# Altium schematic symbol library Schlib.SchLib: 725 symbols (part 6 of 6) (continued)
## TXU0202DTTR
designator U?  (value not drawn)
Two channel fixed-direction level shifter with channels in opposite direction 8-X1SON -40 to 125; Manufacturer: Texas Instruments; Manufacturer Part Number: TXU0202DTTR; Manufacturer Lifecycle Status: ACTIVE; Number of Bits: 2; Supplier: DigiKey; Supplier Part Number: 296-TXU0202DTTRCT-ND; RoHS: Compliant; Category: Voltage Level Shifters; Stock: 4847; Pricing: 1=0.87, 10=0.625, 25=0.5632, 100=0.4949, 250=0.46236, 500=0.4427, 1000=0.42653, 2500=0.40946 (USD); Height: 0m; Length: 1.95mm; Lifecycle Status: Production; Pins: 8; Thickness: 500µm; Width: 1mm; ComponentLink1URL: https://octopart.com:443/opatz8j6/c1?t=p2HXJZBWE-pFoGEOlTjneCnrTkOmH9OxJ_HYdxurKIxSMmIV7N165-jHYGvPUTMIo6_KOagWcpwktg73tXujiVlnUB25hWRjqx6WtDye6qoWhfVu_4d7LnAJ6IkgstcHD4eiH1vlKoDQ2CBJMnPhzI5VAqNwqGUYp90ptjP2t89KyW0ve0Qzd1SuLJzpthln_wwcV8ZzKvLgO7tUY6x9nW2xdtjP7opLNr3Cftf4ocqDTC1i5N5gd5Px9BM7tkVD3T5De5UbGMoRdoeYFjpKWo_XfVgtY4nhCpq51Aae6M7yB6GkqIjur8ipHWO-6hrI4PUfbH8dKUG2HdLonZ1LGPRiB1iUb2ss8JtJM2Z2JwUvC4Z96EvPJwuKPjqCUOgvrNCZub9Y&src-supplier=Texas+Instruments; ComponentLink1Description: https://octopart.com:443/opatz8j6/c1?t=p2HXJZBWE-pFoGEOlTjneCnrTkOmH9OxJ_HYdxurKIxSMmIV7N165-jHYGvPUTMIo6_KOagWcpwktg73tXujiVlnUB25hWRjqx6WtDye6qoWhfVu_4d7LnAJ6IkgstcHD4eiH1vlKoDQ2CBJMnPhzI5VAqNwqGUYp90ptjP2t89KyW0ve0Qzd1SuLJzpthln_wwcV8ZzKvLgO7tUY6x9nW2xdtjP7opLNr3Cftf4ocqDTC1i5N5gd5Px9BM7tkVD3T5De5UbGMoRdoeYFjpKWo_XfVgtY4nhCpq51Aae6M7yB6GkqIjur8ipHWO-6hrI4PUfbH8dKUG2HdLonZ1LGPRiB1iUb2ss8JtJM2Z2JwUvC4Z96EvPJwuKPjqCUOgvrNCZub9Y&src-supplier=Texas+Instruments; ComponentLink2URL: https://datasheet.octopart.com:443/TXU0202DTTR-Texas-Instruments-datasheet-184244561.pdf?src-supplier=LCSC; ComponentLink2Description: https://datasheet.octopart.com:443/TXU0202DTTR-Texas-Instruments-datasheet-184244561.pdf?src-supplier=LCSC; ComponentLink3URL: http://sigma.octopart.com:80/conflict_mineral_statement/Texas-Instruments-company-63.pdf?src-supplier=Compliance+Statements; ComponentLink3Description: http://sigma.octopart.com:80/conflict_mineral_statement/Texas-Instruments-company-63.pdf?src-supplier=Compliance+Statements; ComponentLink4URL: http://sigma.octopart.com:80/reach_statement/Texas-Instruments-company-64.pdf?src-supplier=Compliance+Statements; ComponentLink4Description: http://sigma.octopart.com:80/reach_statement/Texas-Instruments-company-64.pdf?src-supplier=Compliance+Statements
footprint TXU0202DTTR
pins: 1 B2, 2 GND, 3 VCCA, 4 A2Y, 5 A1, 6 OE, 7 VCCB, 8 B1Y

## UJ2-MIBH-G-SMT-TR
designator J?  (value not drawn)
Micro B, USB 2.0, 1.8 A, Right Angle, Surface Mount (SMT), USB Receptacle; MF: CUI Devices; MP: UJ2-MIBH-G-SMT-TR; Value: *; SnapEDA_Link: https://www.snapeda.com/parts/UJ2-MIBH-G-SMT-TR/CUI+Devices/view-part/?ref=snap; Purchase-URL: https://pricing.snapeda.com/search/part/UJ2-MIBH-G-SMT-TR/?ref=eda; Availability: In Stock; Price: None; Package: None; Check_prices: https://www.snapeda.com/parts/UJ2-MIBH-G-SMT-TR/CUI+Devices/view-part/?ref=eda; CUI_purchase_URL: https://www.cuidevices.com/product/interconnect/connectors/usb-connectors/uj2-mibh-g-smt-tr?utm_source=snapeda.com&utm_medium=referral&utm_campaign=snapedaBOM; Manufacturer Part Number: UJ2-MIBH-G-SMT-TR
footprint UJ2-MIBH-G-SMT-TR
pins: 1 VCC, 2 D-, 3 D+, 4 ID, 5 GND, S1 SH, S2 SH, S3 SH, S4 SH

## USB4080-03-A
designator J?  (value not drawn)
USB Type C Rec, 3 Horizontal, SMT, Top mnt, 7.9mm body; Manufacturer: Global Connector Technology; Manufacturer Part Number: USB4080-03-A; Supplier: Farnell; Supplier Part Number: 3801072; RoHS: No; Category: Connectors; Stock: 1785; Pricing: 1=1.11, 10=0.781, 100=0.679, 500=0.595, 1000=0.509, 2500=0.493 (GBP); ComponentLink1URL: https://datasheet.octopart.com/USB4080-03-A-Global-Connector-Technology-datasheet-169726651.pdf?src-supplier=Future+Electronics; ComponentLink1Description: https://datasheet.octopart.com/USB4080-03-A-Global-Connector-Technology-datasheet-169726651.pdf?src-supplier=Future+Electronics
footprint USB4080-03-A
pins: A1 GND_A, A2 SSTXP1, A3 SSTXN1, A4 VBUS_A, A5 CC1, A6 DP1, A7 DN1, A8 SBU1, A9 VBUS_A, A10 SSRXN2, A11 SSRXP2, A12 GND_A, B1 GND_B, B2 SSTXP2, B3 SSTXN2, B4 VBUS_B, B5 CC2, B6 DP2, B7 DN2, B8 SBU2, B9 VBUS_B, B10 SSRXN1, B11 SSRXP1, B12 GND_B, G1 SHIELD, G2 SHIELD, G3 SHIELD, G4 SHIELD

## USB4110GFA
designator J?
USB-C (USB TYPE-C) USB 2.0 Receptacle Connector 24 (16+8 Dummy) Position Surface Mount, Right Angle; Manufacturer Part Number: USB4110GFA
footprint USB4110GFA
pins: ?1 VBUS (power), ?2 VBUS (power), A1/B12 GND (power), A5 CC1 (io), A6 DP1 (io), A7 DN1 (io), A8 SBU1 (io), B1/A12 GND (power), B5 CC2 (io), B6 DP2 (io), B7 DN2 (io), B8 SBU2 (io), S1 GND (power), S2 GND (power), S3 GND (power), S4 GND (power)

## UWF1205S-3WR3
designator PM?  (value not drawn)
DC/DC Converter; 3W; 5V; 600mA; 4.5-36VDC; Manufacturer: MORNSUN; Manufacturer Part Number: UWF1205S-3WR3; Supplier: Digikey; Supplier Part Number: 2725-UWF1205S-3WR3-ND; RoHS: No; Category: Board Mount Modules; Stock: 6626; Pricing: 1=8.16, 5=8.032, 10=7.92, 25=7.6836, 50=7.4588, 100=7.245, 250=7.03124, 500=6.6825 (USD)
footprint UWF1205S-3WR3
pins: 1 GND, 2 VIN, 3 NC, 5 NC, 6 +VO, 7 0V, 8 NC

## VL53L1CBV0FY/1
designator U?  (value not drawn)
Proximity Sensor, Digital, -20To85Deg C Rohs Compliant: Yes; Manufacturer: STMicroelectronics; Manufacturer Part Number: VL53L1CBV0FY/1; Output Type: I2C; Supplier: Mouser; Supplier Part Number: 511-VL53L1CBV0FY/1; RoHS: Yes; Category: Sensors; Stock: 2973; Pricing: 1=7.00000, 10=6.32000, 50=6.02000, 100=5.23000, 1000=4.48000, 10000=4.48000 (USD); Min Operating Temperature: -20°C; Max Operating Temperature: 85°C; RoHS Compliant: Yes; ComponentLink1URL: http://www.st.com/content/ccc/resource/technical/document/datasheet/group3/7d/85/c8/95/fb/3b/4e/2d/DM00452094/files/DM00452094.pdf/jcr:content/translations/en.DM00452094.pdf?src-supplier=Digi-Key; ComponentLink1Description: http://www.st.com/content/ccc/resource/technical/document/datasheet/group3/7d/85/c8/95/fb/3b/4e/2d/DM00452094/files/DM00452094.pdf/jcr:content/translations/en.DM00452094.pdf?src-supplier=Digi-Key
pins: 1 AVDDVCSEL, 2 AVSSVCSEL, 3 GND, 4 GND2, 5 ~{XSHUT}, 6 GND3, 7 GPIO1, 9 SDA, 10 SCL, 11 AVDD, 12 GND4

## VLCF5020T-6R8N1R3-1
designator L?  value 6.8uH  (hidden comment: *)
Inductor Power Shielded Wirewound 6.8uH 30% 100KHz Ferrite 1.8A 165mOhm DCR 2020 Blister T/R; Manufacturer: TDK; Manufacturer Part Number: VLCF5020T-6R8N1R3-1; Supplier: Arrow Electronics; Supplier Part Number: VLCF5020T-6R8N1R3-1; RoHS: Yes; Category: Fixed Inductors; Stock: 13342; Pricing: 1=0.2995, 10=0.295, 25=0.2905, 100=0.2861, 250=0.2816, 500=0.2771, 1000=0.2726, 3000=0.2681, 6000=0.2636 (USD); ComponentLink1URL: https://datasheet.ciiva.com/8045/516785-8045798.pdf?src-supplier=Element14; ComponentLink1Description: https://datasheet.ciiva.com/8045/516785-8045798.pdf?src-supplier=Element14; ComponentLink2URL: https://datasheet.ciiva.com/30187/print-detail-pdf-phplangenpart-novlcf5020t-6r8n1r3-1nreimp-unit-x-30187221.pdf?src-supplier=Onlinecomponents.com; ComponentLink2Description: https://datasheet.ciiva.com/30187/print-detail-pdf-phplangenpart-novlcf5020t-6r8n1r3-1nreimp-unit-x-30187221.pdf?src-supplier=Onlinecomponents.com
footprint VLCF5020T-6R8N1R3-1
pins: 1 B, 2 A

## VLMR334BACB-GS08
designator D?  (value not drawn)
LED Uni-Color Red 632nm Automotive 2-Pin PLCC T/R; Manufacturer: Vishay Semiconductors; Manufacturer Part Number: VLMR334BACB-GS08; Supplier: Mouser; Supplier Part Number: 78-VLMR334BACB-GS08; RoHS: Yes; Category: LEDs; Stock: 44514; Pricing: 1=0.53, 10=0.33, 50=0.33, 100=0.19, 1000=0.149, 10000=0.123 (USD); ComponentLink1URL: https://datasheet.ciiva.com/29562/vlmx334-29562320.pdf?src-supplier=Digi-Key; ComponentLink1Description: https://datasheet.ciiva.com/29562/vlmx334-29562320.pdf?src-supplier=Digi-Key
footprint VLMR334BACB-GS08
pins: 1 C, 2 A

## VO618A-3X017T
designator U?  (value not drawn)
Optocoupler Collector-emitter breakdown voltage: 80 V Input forward current: 60 mA; Manufacturer: Vishay Semiconductors; Manufacturer Part Number: VO618A-3X017T; Supplier: Rs; Supplier Part Number: 7730180P; RoHS: Yes; Category: Optocouplers; Stock: 910; Pricing: 100=0.205, 250=0.184, 500=0.153, 1000=0.146 (EUR); ComponentLink1URL: https://datasheet.ciiva.com/2087/vo618a-2087431.pdf?src-supplier=Digikey; ComponentLink1Description: https://datasheet.ciiva.com/2087/vo618a-2087431.pdf?src-supplier=Digikey; ComponentLink2URL: https://datasheet.ciiva.com/2087/vo618a-2087432.pdf?src-supplier=Digikey; ComponentLink2Description: https://datasheet.ciiva.com/2087/vo618a-2087432.pdf?src-supplier=Digikey; ComponentLink3URL: https://datasheet.ciiva.com/2087/vo618a-2087433.pdf?src-supplier=Digikey; ComponentLink3Description: https://datasheet.ciiva.com/2087/vo618a-2087433.pdf?src-supplier=Digikey
footprint VO618A-3X017T
pins: 1 A1, 2 C1, 3 E2, 4 CO2

## VOD207T
designator U?  (value not drawn)
Optocoupler DC-IN 2-CH Transistor DC-OUT 8-Pin SOIC T/R; Manufacturer: Vishay; Manufacturer Part Number: VOD207T; Supplier: Mouser; Supplier Part Number: 78-VOD207T; RoHS: Yes; Category: Optocouplers; Stock: 42473; Pricing: 1=1, 10=0.631, 50=0.631, 100=0.467, 1000=0.353, 10000=0.312 (USD); ComponentLink1URL: https://datasheet.ciiva.com/8040/485134-8040986.pdf?src-supplier=Element14; ComponentLink1Description: https://datasheet.ciiva.com/8040/485134-8040986.pdf?src-supplier=Element14; ComponentLink2URL: https://datasheet.ciiva.com/18616/vod205t-18616631.pdf?src-supplier=Digikey; ComponentLink2Description: https://datasheet.ciiva.com/18616/vod205t-18616631.pdf?src-supplier=Digikey; ComponentLink3URL: https://datasheet.ciiva.com/8086/vod205t-8086125.pdf?src-supplier=Avnet; ComponentLink3Description: https://datasheet.ciiva.com/8086/vod205t-8086125.pdf?src-supplier=Avnet; ComponentLink4URL: https://datasheet.ciiva.com/5798/485134-5798973.pdf?src-supplier=Farnell; ComponentLink4Description: https://datasheet.ciiva.com/5798/485134-5798973.pdf?src-supplier=Farnell
footprint VOD207T
pins: 1 A1, 2 C1, 3 A2, 4 C2, 5 E1, 6 CO1, 7 E2, 8 CO2

## W25Q80DVZPIG
designator U?  (value not drawn)
NOR Flash Serial (SPI, Dual SPI, Quad SPI) 3V/3.3V 8M-bit 1M x 8 6ns 8-Pin WSON EP Tube; Manufacturer: Winbond; Manufacturer Part Number: W25Q80DVZPIG; Clock Rate: 104MHz; Density: 8Mb; Max Supply Current: 25mA; Max Supply Voltage: 3.6V; Min Supply Voltage: 2.7V; Number of Circuits: 1; Operating Supply Voltage: 3V; Page Size: 256B; Supplier: DigiKey; Supplier Part Number: W25Q80DVZPIG-ND; RoHS: Compliant; Category: Flash; Stock: 1100; Pricing: 1=0.64, 10=0.604, 25=0.588, 50=0.5756, 100=0.5631, 300=0.54297, 500=0.5336, 1000=0.52089, 5000=0.4917 (USD); China RoHS: Compliant; Frequency: 104MHz; Height - Seated (Max): 800µm; Interface: Serial; Length: 6mm; Lifecycle Status: Production; Max Operating Temperature: 85°C; Memory Format: FLASH; Min Operating Temperature: -40°C; Pins: 8; Number of Terminals: 8; REACH SVHC: Yes; Schedule B: 8542320070, 8542320070|8542320070|8542320070|8542320070|8542320070; Terminal Pitch: 1.27mm; Width: 5mm; ComponentLink1URL: https://datasheet.octopart.com:443/W25Q80DVZPIG-Winbond-datasheet-181529489.pdf?src-supplier=IHS; ComponentLink1Description: https://datasheet.octopart.com:443/W25Q80DVZPIG-Winbond-datasheet-181529489.pdf?src-supplier=IHS; ComponentLink2URL: https://datasheet.octopart.com:443/W25Q80DVZPIG-Winbond-datasheet-163661270.pdf?src-supplier=Augswan; ComponentLink2Description: https://datasheet.octopart.com:443/W25Q80DVZPIG-Winbond-datasheet-163661270.pdf?src-supplier=Augswan; ComponentLink3URL: https://datasheet.octopart.com:443/W25Q80DVZPIG-Winbond-datasheet-123053876.pdf?src-supplier=ODG+(Origin+Data+Global); ComponentLink3Description: https://datasheet.octopart.com:443/W25Q80DVZPIG-Winbond-datasheet-123053876.pdf?src-supplier=ODG+(Origin+Data+Global)
footprint 8-WSON (6x5)
pins: 1 ~{CS}, 2 SO(IO1), 3 ~{WP!(IO2)}, 4 GND, 5 SI(IO0), 6 SCK, 7 ~{HOLD!(IO3)}, 8 VCC

## W25Q256JVEIQ
designator U?
FLASH - NOR Memory IC 256Mb (32M x 8) SPI - Quad I/O 133 MHz 8-WSON (8x6); Manufacturer Part Number: W25Q256JVEIQ
footprint SON127P600X800X80-9N
pins: 1 ~{CS} (in), 2 DO/(IO1) (io), 3 ~{WP}/(IO2) (io), 4 GND (power), 5 DI/(IO0) (io), 6 CLK (in), 7 ~{HOLD}/~{RESET}/(~{IO}3~{)} (io), 8 VCC (power), 9 EXP

## WE-TVS_SOT23-6L_82402304
designator D?
SOT-23-6 WE-TVS 4 Surface Mount Zener Tvs Diode 6V 6A 8/20mus 13pF -55C~85C TJ; Manufacturer: Wurth Elektronik; Manufacturer Part Number: 82402304; Clamping Voltage: 6.8V; Direction: Unidirectional; Element Configuration: Common Anode; ESD Protection: Yes; Forward Voltage: 800mV; Max Reverse Leakage Current: 2.5A; Number of Channels: 4; Power Line Protection: No; Reverse Standoff Voltage: 5V; Test Current: 1mA; Supplier: RS; Supplier Part Number: 7546241; RoHS: Compliant; Category: TVS Diodes; Stock: 40; Pricing: 5=0.6, 50=0.39, 250=0.372, 500=0.354 (GBP); Breakdown Voltage: 6V; Value: 13pF; Case/Package: SOT-23; Composition: Zener; Height: 1.16mm; Length: 2.9mm; Max Breakdown Voltage: 6V; Max Operating Temperature: 85°C; Max Surge Current: 6A; Min Breakdown Voltage: 6V; Min Operating Temperature: -55°C; Mounting Technology: Surface Mount; Pins: 6; Number of Unidirectional Channels: 4; Peak Pulse Current: 6A; Polarity: Unidirectional; Termination: SMD/SMT; Width: 2.8mm; Working Voltage: 5V; ComponentLink1URL: https://datasheet.octopart.com:443/82402304-Wurth-Elektronik-datasheet-168501694.pdf?src-supplier=Wurth+Elektronik; ComponentLink1Description: https://datasheet.octopart.com:443/82402304-Wurth-Elektronik-datasheet-168501694.pdf?src-supplier=Wurth+Elektronik; ComponentLink2URL: https://datasheet.octopart.com:443/82402304-W%C3%BCrth-Elektronik-Midcom-datasheet-8823349.pdf?src-supplier=Upverter; ComponentLink2Description: https://datasheet.octopart.com:443/82402304-W%C3%BCrth-Elektronik-Midcom-datasheet-8823349.pdf?src-supplier=Upverter; ComponentLink3URL: https://datasheet.octopart.com:443/82402304-W%C3%BCrth-Elektronik-datasheet-11476837.pdf?src-supplier=RS+(Formerly+Allied+Electronics); ComponentLink3Description: https://datasheet.octopart.com:443/82402304-W%C3%BCrth-Elektronik-datasheet-11476837.pdf?src-supplier=RS+(Formerly+Allied+Electronics)
footprint WE-TVS_SOT23-6L
pins: 1, 2 GND, 3 2, 4 3, 5 GND@1, 6 4
text: I/O1; I/O4; I/O2; I/O3

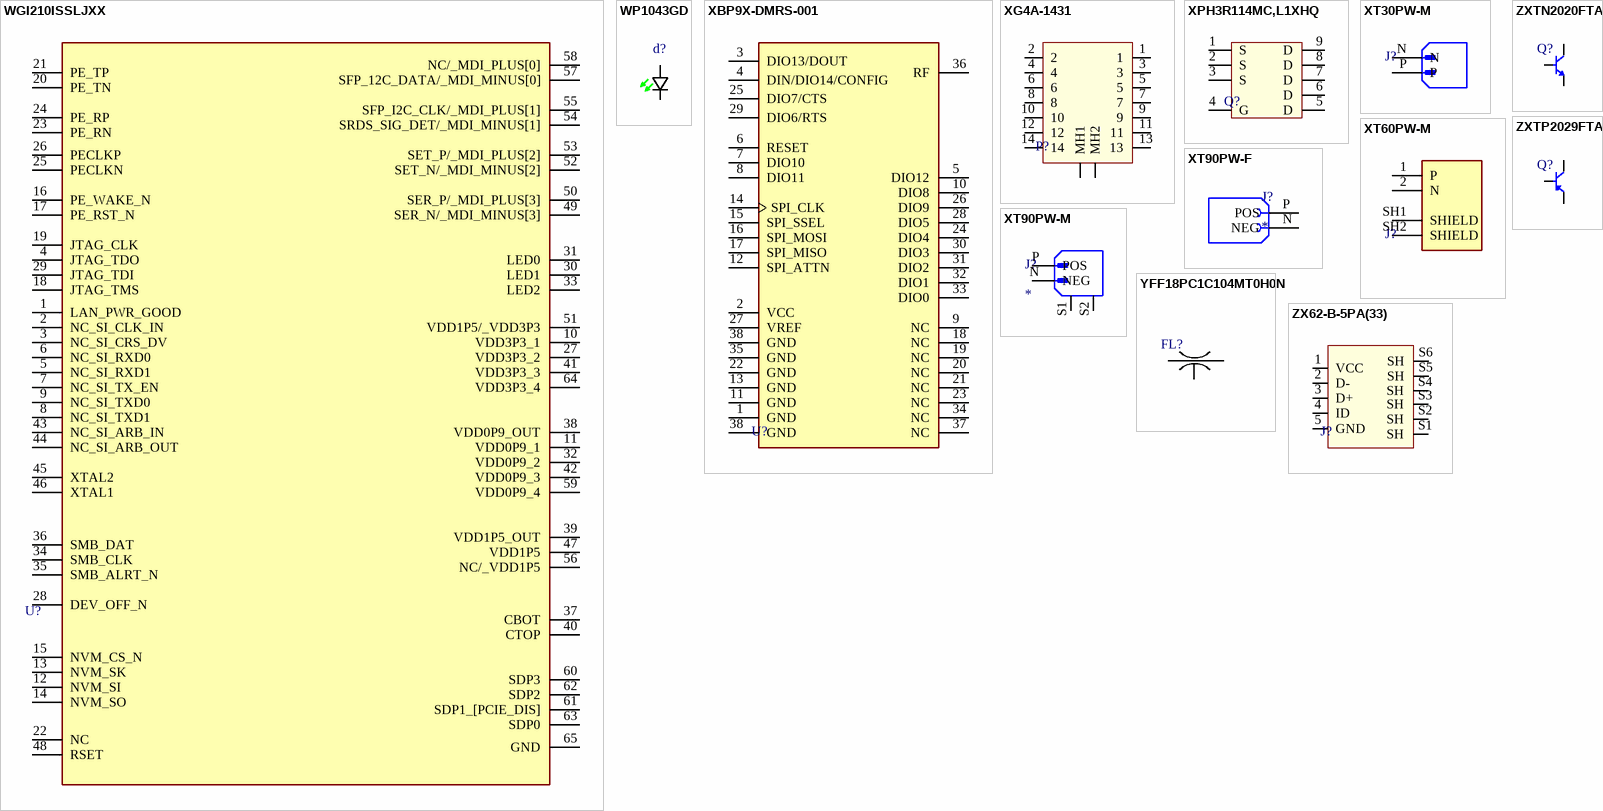
[diagram p21: symbols WGI210ISSLJXX to ZXTP2029FTA]

## WGI210ISSLJXX
designator U?  (value not drawn)
Ethernet Controller Single Chip 10/100Mbps PCIe v2.1 (2.5 GT/s) 0.9V/1.5V/3.3V 64-Pin QFN Tray; Manufacturer: Intel; Manufacturer Part Number: WGI210ISSLJXX; Data Rate: 1000Mbps; Max Supply Voltage: 3.465V; Min Supply Voltage: 2.97V; Number of Transceivers: 1; Supplier: Worldway Electronics; Supplier Part Number: WGI210IS S LJXX; RoHS: Yes; Category: Ethernet Interface ICs; Stock: 2708; Pricing: 2=7.6084, 10=7.4562, 100=7.228, 500=6.9997, 1000=6.8476 (USD); Case/Package: QFN; Min Operating Temperature: -40°C; Max Operating Temperature: 85°C; Packaging: Tray; Series: I210; RoHS Compliant: Yes; ComponentLink1URL: https://datasheet.ciiva.com/24020/i210-ethernet-controller-datasheet-257785-24020470.pdf?src-supplier=Mouser; ComponentLink1Description: https://datasheet.ciiva.com/24020/i210-ethernet-controller-datasheet-257785-24020470.pdf?src-supplier=Mouser
footprint WGI210ISSLJXX
pins: 1 LAN_PWR_GOOD, 2 NC_SI_CLK_IN, 3 NC_SI_CRS_DV, 4 JTAG_TDO, 5 NC_SI_RXD1, 6 NC_SI_RXD0, 7 NC_SI_TX_EN, 8 NC_SI_TXD1, 9 NC_SI_TXD0, 10 VDD3P3_1, 11 VDD0P9_1, 12 NVM_SI, 13 NVM_SK, 14 NVM_SO, 15 NVM_CS_N, 16 PE_WAKE_N, 17 PE_RST_N, 18 JTAG_TMS, 19 JTAG_CLK, 20 PE_TN, 21 PE_TP, 22 NC, 23 PE_RN, 24 PE_RP, 25 PECLKN, 26 PECLKP, 27 VDD3P3_2, 28 DEV_OFF_N, 29 JTAG_TDI, 30 LED1, 31 LED0, 32 VDD0P9_2, 33 LED2, 34 SMB_CLK, 35 SMB_ALRT_N, 36 SMB_DAT, 37 CBOT, 38 VDD0P9_OUT, 39 VDD1P5_OUT, 40 CTOP, 41 VDD3P3_3, 42 VDD0P9_3, 43 NC_SI_ARB_IN, 44 NC_SI_ARB_OUT, 45 XTAL2, 46 XTAL1, 47 VDD1P5, 48 RSET, 49 SER_N/_MDI_MINUS[3], 50 SER_P/_MDI_PLUS[3], 51 VDD1P5/_VDD3P3, 52 SET_N/_MDI_MINUS[2], 53 SET_P/_MDI_PLUS[2], 54 SRDS_SIG_DET/_MDI_MINUS[1], 55 SFP_I2C_CLK/_MDI_PLUS[1], 56 NC/_VDD1P5, 57 SFP_12C_DATA/_MDI_MINUS[0], 58 NC/_MDI_PLUS[0], 59 VDD0P9_4, 60 SDP3, 61 SDP1_[PCIE_DIS], 62 SDP2, 63 SDP0, 64 VDD3P3_4, 65 GND

## WP1043GD
designator d?  (value not drawn)
LED Light Bar Uni-Color Green 565nm 2-Pin Chip LED Bulk; Manufacturer: Kingbright; Manufacturer Part Number: WP1043GD; Supplier: Sager Electronics; Supplier Part Number: WP1043GD; RoHS: Yes; Category: LEDs; Stock: 250; Pricing: 1000=0.3749 (USD); ComponentLink1URL: https://datasheet.ciiva.com/12082/wp1043gd-19906-12082992.pdf?src-supplier=Mouser; ComponentLink1Description: https://datasheet.ciiva.com/12082/wp1043gd-19906-12082992.pdf?src-supplier=Mouser; ComponentLink2URL: https://datasheet.ciiva.com/16510/wp1043gd-16510276.pdf?src-supplier=Future+Electronics; ComponentLink2Description: https://datasheet.ciiva.com/16510/wp1043gd-16510276.pdf?src-supplier=Future+Electronics; ComponentLink3URL: https://datasheet.ciiva.com/2137/wp1043gd-2137221.pdf?src-supplier=Digikey; ComponentLink3Description: https://datasheet.ciiva.com/2137/wp1043gd-2137221.pdf?src-supplier=Digikey
pins: 1 C, 2 A

## XBP9X-DMRS-001
designator U?  (value not drawn)
XBee-PRO SX, 1W, DigiMesh, Point to Multipoint, SMT, RF Pad, North America; Manufacturer: Digi International; Manufacturer Part Number: XBP9X-DMRS-001; Frequency: 928MHz; Data Rate: 250Kbps; Sensitivity: -113dBm; Current - Receiving: 40mA; Current - Transmitting: 330mA; Supplier: Avnet; Supplier Part Number: XBP9X-DMRS-001; RoHS: Yes; Category: RF Receivers, Transceivers; Stock: 2; Pricing: 36=112.59 (USD); Mounting Technology: Surface Mount; Case/Package: Module; Min Operating Temperature: -40°C; Max Operating Temperature: 85°C; Packaging: Tray; Series: -; Lead Free: Lead Free; ComponentLink1URL: http://www.digi.com/resources/documentation/digidocs/pdfs/90001477.pdf?src-supplier=Digi-Key; ComponentLink1Description: http://www.digi.com/resources/documentation/digidocs/pdfs/90001477.pdf?src-supplier=Digi-Key
footprint XBP9X-DMRS-001
pins: 1 GND (power), 2 VCC (power), 3 DIO13/DOUT, 4 DIN/DIO14/CONFIG , 5 DIO12, 6 RESET, 7 DIO10, 8 DIO11, 9 NC, 10 DIO8, 11 GND (power), 12 SPI_ATTN, 13 GND (power), 14 SPI_CLK, 15 SPI_SSEL, 16 SPI_MOSI, 17 SPI_MISO, 18 NC, 19 NC, 20 NC, 21 NC, 22 GND (power), 23 NC, 24 DIO4, 25 DIO7/CTS, 26 DIO9, 27 VREF (power), 28 DIO5, 29 DIO6/RTS, 30 DIO3, 31 DIO2, 32 DIO1, 33 DIO0, 34 NC, 35 GND (power), 36 RF, 37 NC, 38 GND (power), 38 GND (power)

## XG4A-1431
designator P?  (value not drawn)
MIL Plugs with Long Locks; straight DIP terminals, 2.54mm Pitch, 14 Contacts, RoHS; Manufacturer: Omron; Manufacturer Part Number: XG4A-1431; Contact Resistance: 20mR; Max Voltage Rating (AC): 300V; Max Current Rating: 3A; Number of Positions: 14; Gender: Male; Insulation Resistance: 1GR; Row Spacing: 0.1inch; Supplier: Mouser; Supplier Part Number: 653-XG4A-1431; RoHS: Yes; Category: Connectors; Stock: 4754; Pricing: 1=1.72, 10=1.67, 50=1.43, 100=1.28, 1000=1.06, 10000=1.01 (USD); Mounting Technology: Through Hole; Color: Black; Contact Material: Brass; Contact Plating: Gold; Housing Material: Polybutylene; Housing Color: Black; Min Operating Temperature: -55°C; Max Operating Temperature: 105°C; Number of Rows: 2; Packaging: Bulk; Contact Gender: Male; Current Rating: 3A; Voltage Rating: 300V; Termination: Solder; Number of Contacts: 14; Orientation: Straight; Series: XG4; Contact Type: Male Pin; Package Quantity: 80; Fastening Type: Latch; Length: 37.1mm; Pitch: 2.54mm; Depth: 8.5mm; RoHS Compliant: Yes; Reach SVHC Compliant: Unknown; ComponentLink1URL: https://datasheet.ciiva.com/7092/1651251-7092132.pdf?src-supplier=Newark; ComponentLink1Description: https://datasheet.ciiva.com/7092/1651251-7092132.pdf?src-supplier=Newark; ComponentLink2URL: https://datasheet.ciiva.com/30051/xg4-0110-30051558.pdf?src-supplier=Onlinecomponents.com; ComponentLink2Description: https://datasheet.ciiva.com/30051/xg4-0110-30051558.pdf?src-supplier=Onlinecomponents.com
footprint XG4A-1431
pins: 1, 2, 3, 4, 5, 6, 7, 8, 9, 10, 11, 12, 13, 14, MH1, MH2

## XPH3R114MC,L1XHQ
designator Q?  (value not drawn)
Mosfet P-ch 40V 100A 8SOP; Manufacturer: Toshiba; Manufacturer Part Number: XPH3R114MC,L1XHQ; Supplier: Digi-Key; Supplier Part Number: 264-XPH3R114MCL1XHQCT-ND; RoHS: No; Stock: 4928; Pricing: 1=2.23000, 10=2.00300, 100=1.61030, 500=1.32300, 1000=1.09620, 2000=1.02060 (USD)
footprint XPH3R114MC,L1XHQ
pins: 1 S, 2 S, 3 S, 4 G, 5 D, 6 D, 7 D, 8 D, 9 D

## XT30PW-M
designator J?  (value not drawn)
Manufacturer: Unclassified; Manufacturer Part Number: XT30PW-M; Supplier: Rs; Supplier Part Number: 1805359; RoHS: No
footprint XT30PW-M
pins: N, P

## XT60PW-M
designator J?
Socket, DC supply, male, PIN: 2; Manufacturer Part Number: XT60PW-M
footprint AMASS_XT60PW-M
pins: 1 P, 2 N, SH1 SHIELD, SH2 SHIELD

## XT90PW-F
designator J?
Socket, DC supply, XT90, female, PIN:2, on PCBs, THT; MF: AMASS; MP: XT90PW-F; SnapEDA_Link: https://www.snapeda.com/parts/XT90PW-F/AMASS/view-part/?ref=snap; Availability: Not in stock; Price: None; Package: Package; Check_prices: https://www.snapeda.com/parts/XT90PW-F/AMASS/view-part/?ref=eda; Value: *; Manufacturer Part Number: XT90PW-F
footprint XT90PW-F (AMASS)
pins: N NEG, P POS

## XT90PW-M
designator J?
Socket; DC supply; XT90; male; PIN: 2; on PCBs; THT; Colour: yellow; MP: XT90PW-M; MF: AMASS; Package: Package; Availability: Not in stock; Value: *; Price: None; Check_prices: https://www.snapeda.com/parts/XT90PW-M/AMASS/view-part/?ref=eda; SnapEDA_Link: https://www.snapeda.com/parts/XT90PW-M/AMASS/view-part/?ref=snap; Manufacturer Part Number: XT90PW-M
footprint XT90PW-M (AMASS)
pins: N NEG, P POS, S1, S2

## YFF18PC1C104MT0H0N
designator FL?  (value not drawn)
Cap Feed Through 0.1uF 16VDC 20% Flat 0603 125°C; Manufacturer: TDK; Manufacturer Part Number: YFF18PC1C104MT0H0N; Value: 100nF; Voltage Rating: 16V; Current: 4A; Insertion Loss: 40dB; Supplier: Rs; Supplier Part Number: 1447425; RoHS: Yes; Category: Capacitors; Stock: 2360; Pricing: 20=0.194, 200=0.125, 500=0.116, 4000=0.092, 5000=0.088 (GBP); Mounting Technology: Surface Mount; Case/Package: 0603; Case Code (Metric): 1608; Case Code (Imperial): 0603; Min Operating Temperature: -55°C; Max Operating Temperature: 125°C; Packaging: Cut Tape; Tolerance: 20%; Series: YFF-P; RoHS Compliant: Yes; ComponentLink1URL: http://www.farnell.com/datasheets/2211503.pdf?src-supplier=Farnell; ComponentLink1Description: http://www.farnell.com/datasheets/2211503.pdf?src-supplier=Farnell; ComponentLink2URL: https://product.tdk.com/info/en/catalog/datasheets/3tf_commercial_yff-p_en.pdf?src-supplier=Digi-Key; ComponentLink2Description: https://product.tdk.com/info/en/catalog/datasheets/3tf_commercial_yff-p_en.pdf?src-supplier=Digi-Key; ComponentLink3URL: http://www.farnell.com/datasheets/2211503.pdf?src-supplier=Element14; ComponentLink3Description: http://www.farnell.com/datasheets/2211503.pdf?src-supplier=Element14
footprint YFF18PC1C104MT0H0N
pins: 1 IN/OUT, 2 OUT/IN, 3 GND (power)

## ZX62-B-5PA(33)
designator J?  (value not drawn)
USB Connector, 5 Contact(s), Male, Right Angle, Surface Mount Terminal, Locking, Receptacle; Manufacturer: Hirose; Manufacturer Part Number: ZX62-B-5PA(33); Contact Voltage Rating (AC): 30V; Data Rate: 480Mbps; Number of Positions: 5NUMBER; Contact Pitch: 650um; Supplier: Rs; Supplier Part Number: 1362267P; RoHS: Yes; Category: USB Connectors; Stock: 14910; Pricing: 50=0.596, 125=0.518, 250=0.49 (GBP); Pins: 5NUMBER; Voltage Rating: 30V; Voltage Rating (AC): 30V; Length: 7.8mm; Width: 5mm; Height: 2.5mm; Pitch: 650um; ComponentLink1URL: http://www.farnell.com/datasheets/2691174.pdf?src-supplier=Farnell; ComponentLink1Description: http://www.farnell.com/datasheets/2691174.pdf?src-supplier=Farnell; ComponentLink2URL: http://www.farnell.com/datasheets/2691174.pdf?src-supplier=Element14; ComponentLink2Description: http://www.farnell.com/datasheets/2691174.pdf?src-supplier=Element14; ComponentLink3URL: http://www.farnell.com/datasheets/2060515.pdf?src-supplier=Element14; ComponentLink3Description: http://www.farnell.com/datasheets/2060515.pdf?src-supplier=Element14; ComponentLink4URL: http://www.farnell.com/datasheets/2691174.pdf?src-supplier=Newark; ComponentLink4Description: http://www.farnell.com/datasheets/2691174.pdf?src-supplier=Newark; ComponentLink5URL: https://www.hirose.com/product/en/download_file/key_name/ZX62-B-5PA%2833%29/category/Specification%20Sheet/doc_file_id/87473/?file_category_id=9&item_id=02420033833&is_series=&src-supplier=Digi-Key; ComponentLink5Description: https://www.hirose.com/product/en/download_file/key_name/ZX62-B-5PA%2833%29/category/Specification%20Sheet/doc_file_id/87473/?file_category_id=9&item_id=02420033833&is_series=&src-supplier=Digi-Key; ComponentLink6URL: https://datasheet.octopart.com/ZX62-B-5PA%2833%29-Hirose-datasheet-62127783.pdf?src-supplier=Future+Electronics; ComponentLink6Description: https://datasheet.octopart.com/ZX62-B-5PA%2833%29-Hirose-datasheet-62127783.pdf?src-supplier=Future+Electronics; ComponentLink7URL: https://datasheet.octopart.com/ZX62-B-5PA%2833%29-Hirose-datasheet-152758979.pdf?src-supplier=TME; ComponentLink7Description: https://datasheet.octopart.com/ZX62-B-5PA%2833%29-Hirose-datasheet-152758979.pdf?src-supplier=TME; ComponentLink8URL: https://datasheet.octopart.com/ZX62-B-5PA%2833%29-Hirose-datasheet-137799493.pdf?src-supplier=LKR; ComponentLink8Description: https://datasheet.octopart.com/ZX62-B-5PA%2833%29-Hirose-datasheet-137799493.pdf?src-supplier=LKR
footprint ZX62-B-5PA(33)
pins: 1 VCC, 2 D-, 3 D+, 4 ID, 5 GND, S1 SH, S2 SH, S3 SH, S4 SH, S5 SH, S6 SH

## ZXTN2020FTA
designator Q?  (value not drawn)
ZXTN2020F Series 4 A 100 V SMT NPN Silicon Medium Power Transistor - SOT-23; Manufacturer: Diodes Zetex; Manufacturer Part Number: ZXTN2020FTA; Supplier: Future Electronics; Supplier Part Number: 7584691; RoHS: Yes; Category: BJTs; Stock: 3000; Pricing: 3000=0.295, 6000=0.29, 9000=0.285, 12000=0.285, 15000=0.275 (USD); ComponentLink1URL: https://datasheet.ciiva.com/15139/getdatasheetpartid-139500-15139456.pdf?src-supplier=Verical; ComponentLink1Description: https://datasheet.ciiva.com/15139/getdatasheetpartid-139500-15139456.pdf?src-supplier=Verical; ComponentLink2URL: https://datasheet.ciiva.com/4723/zxtn2020f-4723587.pdf?src-supplier=Mouser; ComponentLink2Description: https://datasheet.ciiva.com/4723/zxtn2020f-4723587.pdf?src-supplier=Mouser; ComponentLink3URL: https://datasheet.ciiva.com/11201/zxtn2020f-11201573.pdf?src-supplier=Avnet; ComponentLink3Description: https://datasheet.ciiva.com/11201/zxtn2020f-11201573.pdf?src-supplier=Avnet; ComponentLink4URL: https://datasheet.ciiva.com/975/zxtn2020f-975686.pdf?src-supplier=Digi-Key; ComponentLink4Description: https://datasheet.ciiva.com/975/zxtn2020f-975686.pdf?src-supplier=Digi-Key; ComponentLink5URL: https://datasheet.ciiva.com/975/zxtn2020f-975687.pdf?src-supplier=Digi-Key; ComponentLink5Description: https://datasheet.ciiva.com/975/zxtn2020f-975687.pdf?src-supplier=Digi-Key; ComponentLink6URL: https://datasheet.ciiva.com/11206/zxtn2020f-11206663.pdf?src-supplier=Avnet; ComponentLink6Description: https://datasheet.ciiva.com/11206/zxtn2020f-11206663.pdf?src-supplier=Avnet
footprint SOT-23-3
pins: 1 B, 2 E, 3 C

## ZXTP2029FTA
designator Q?  (value not drawn)
ZXTP2029F Series 100 V 3 A PNP SMT Medium Power Transistor - SOT-23; Manufacturer: Diodes Zetex; Manufacturer Part Number: ZXTP2029FTA; Max Power Dissipation: 1.56W; Collector Emitter Voltage (VCEO): 100V; Frequency: 150MHz; Number of Elements: 1; Max Collector Current: 3A; Collector Base Voltage (VCBO): 130V; Emitter Base Voltage (VEBO): 7V; Collector Emitter Saturation Voltage: -135mV; Current Rating: -3A; Voltage Rating (DC): -100V; Collector-emitter Voltage-Max: 250mV; Supplier: Rs; Supplier Part Number: 155024P; RoHS: Yes; Category: BJTs; Stock: 2560; Pricing: 10=0.567 (GBP); Mounting Technology: Surface Mount; Case/Package: SOT-23; Pins: 3; Weight: 0.000282oz; Min Operating Temperature: -55°C; Max Operating Temperature: 150°C; Package Quantity: 3000; Packaging: Tape and Reel; Polarity: PNP; Transition Frequency: 150MHz; Collector Emitter Breakdown Voltage: 100V; Max Breakdown Voltage: 100V; Power Dissipation: 1.56W; Clock Frequency: 150MHz; Gain Bandwidth Product: 150MHz; Series: -; Length: 3.05mm; Width: 1.4mm; Height: 1mm; Radiation Hardening: No; Reach SVHC Compliant: Yes; Lead Free: Lead Free; RoHS Compliant: Yes; ComponentLink1URL: https://datasheet.ciiva.com/4723/zxtp2029f-4723312.pdf?src-supplier=Mouser; ComponentLink1Description: https://datasheet.ciiva.com/4723/zxtp2029f-4723312.pdf?src-supplier=Mouser; ComponentLink2URL: https://datasheet.ciiva.com/15139/getdatasheetpartid-185688-15139695.pdf?src-supplier=Verical; ComponentLink2Description: https://datasheet.ciiva.com/15139/getdatasheetpartid-185688-15139695.pdf?src-supplier=Verical; ComponentLink3URL: https://datasheet.ciiva.com/975/zxtp2029f-975683.pdf?src-supplier=Digi-Key; ComponentLink3Description: https://datasheet.ciiva.com/975/zxtp2029f-975683.pdf?src-supplier=Digi-Key; ComponentLink4URL: https://datasheet.ciiva.com/975/zxtp2029f-975684.pdf?src-supplier=Digi-Key; ComponentLink4Description: https://datasheet.ciiva.com/975/zxtp2029f-975684.pdf?src-supplier=Digi-Key; ComponentLink5URL: https://datasheet.ciiva.com/11206/zxtp2029f-11206583.pdf?src-supplier=Avnet; ComponentLink5Description: https://datasheet.ciiva.com/11206/zxtp2029f-11206583.pdf?src-supplier=Avnet; ComponentLink6URL: https://datasheet.ciiva.com/11201/zxtp2029f-11201509.pdf?src-supplier=Avnet; ComponentLink6Description: https://datasheet.ciiva.com/11201/zxtp2029f-11201509.pdf?src-supplier=Avnet
footprint SOT-23-3
pins: 1 B, 2 E, 3 C